# Altium footprint library SBCLib.PcbLib: 120 footprints (part 1 of 8)
Each footprint in its own frame and in the unit in brackets; x right, y up, seen from the top. Pads: shape width x height; smd on the part's side, far side on the other; paste and mask are expansions set on the pad; w line width, h text height; cw(c..) or ccw(c..) is an arc to the next point about the centre after c.
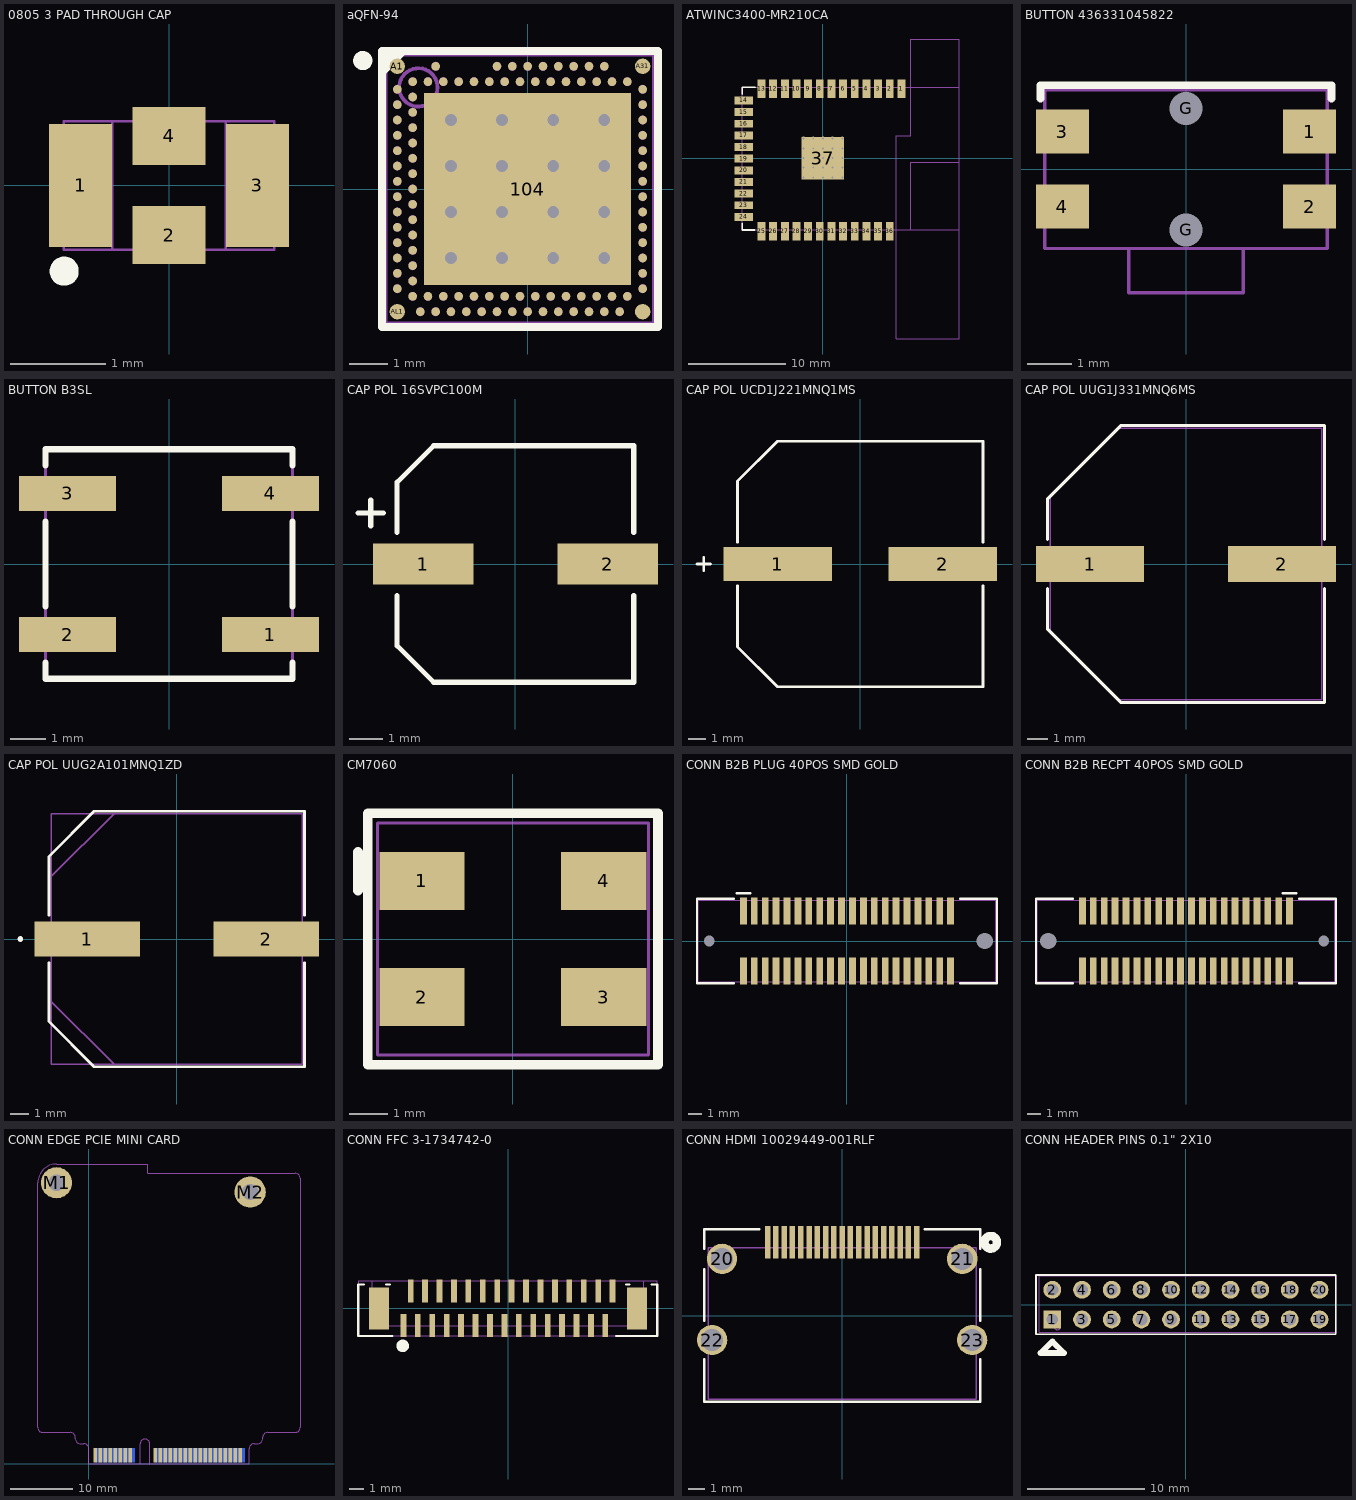
[diagram p0: the footprints below, top view; thin cyan lines are the x and y axes]

## 0805 3 PAD THROUGH CAP [mil]
pads (4):
  rect 26x51 smd paste+0 mask+0: 1(-36.5,0) 3(36.5,0)
  rect 30x24 smd paste+0 mask+0: 2(0,-20.5) 4(0,20.5)
Top Overlay:
  circle w6: c-43.31,-35.43 r3
Mechanical 3:
  circle w0: c-26.5,0 r3
  lines w1: -43.5,-26.5 -23.5,-26.5 -23.5,26.5 -43.5,26.5 ; -43.5,-26.5 -43.5,26.5 ; -43.5,-26.5 -43.5,26.5 ; -43.5,-26.5 43.5,-26.5 ; -43.5,26.5 43.5,26.5 ; 43.5,-26.5 23.5,-26.5 23.5,26.5 43.5,26.5 ; 43.5,-26.5 43.5,26.5 ; 43.5,-26.5 43.5,26.5
3D body "NFM21PC225B0J3D_MUR.step": height 37.01, standoff 0, extent -43.5,-26.18 43.5,26.81

## aQFN-94 [mm] "NRF5340"
pads (115):
  rect 5.4x5 smd paste-5 mask+0.05: 104(0,0)
  round 0.4 smd paste+0.012 mask+0.05: A1(-3.4,3.2) A31(3,3.2) AL1(-3.4,-3.2) AL31(3,-3.2)
  round 0.225 smd paste+0.012 mask+0.05: A5(-2.4,3.2) A13(-0.8,3.2) A15(-0.4,3.2) A17(0,3.2) A19(0.4,3.2) A21(0.8,3.2) A23(1.2,3.2) A25(1.6,3.2) A27(2,3.2) AA1(-3.4,-1) AA31(3,-1) AB2(-3,-1.2) AC1(-3.4,-1.4) AC31(3,-1.4) AD2(-3,-1.6) AE1(-3.4,-1.8) AE31(3,-1.8) AF2(-3,-2) AG1(-3.4,-2.2) AG31(3,-2.2) AH2(-3,-2.4) AJ1(-3.4,-2.6) AJ31(3,-2.6) AK2(-3,-2.8) AK4(-2.6,-2.8) AK6(-2.2,-2.8) AK8(-1.8,-2.8) AK10(-1.4,-2.8) AK12(-1,-2.8) AK14(-0.6,-2.8) AK16(-0.2,-2.8) AK18(0.2,-2.8) AK20(0.6,-2.8) AK22(1,-2.8) AK24(1.4,-2.8) AK26(1.8,-2.8) AK28(2.2,-2.8) AK30(2.6,-2.8) AL3(-2.8,-3.2) AL5(-2.4,-3.2) AL7(-2,-3.2) AL9(-1.6,-3.2) AL11(-1.2,-3.2) AL13(-0.8,-3.2) AL15(-0.4,-3.2) AL17(0,-3.2) AL19(0.4,-3.2) AL21(0.8,-3.2) AL23(1.2,-3.2) AL25(1.6,-3.2) AL27(2,-3.2) AL29(2.4,-3.2) B2(-3,2.8) B4(-2.6,2.8) B6(-2.2,2.8) B8(-1.8,2.8) B10(-1.4,2.8) B12(-1,2.8) B14(-0.6,2.8) B16(-0.2,2.8) B18(0.2,2.8) B20(0.6,2.8) B22(1,2.8) B24(1.4,2.8) B26(1.8,2.8) B28(2.2,2.8) B30(2.6,2.8) C1(-3.4,2.6) C31(3,2.6) D2(-3,2.4) E1(-3.4,2.2) E31(3,2.2) F2(-3,2) G1(-3.4,1.8) G31(3,1.8) H2(-3,1.6) J1(-3.4,1.4) J31(3,1.4) K2(-3,1.2) L1(-3.4,1) L31(3,1) M2(-3,0.8) N1(-3.4,0.6) N31(3,0.6) P2(-3,0.4) R1(-3.4,0.2) R31(3,0.2) T2(-3,0) U1(-3.4,-0.2) U31(3,-0.2) V2(-3,-0.4) W1(-3.4,-0.6) W31(3,-0.6) Y2(-3,-0.8)
  rrect50% 1.1x1 on Top Paste: ""(-1.95,-1.8) ""(-1.95,-0.6) ""(-1.95,0.6) ""(-1.95,1.8) ""(-0.65,-1.8) ""(-0.65,-0.6) ""(-0.65,0.6) ""(-0.65,1.8) ""(0.65,-1.8) ""(0.65,-0.6) ""(0.65,0.6) ""(0.65,1.8) ""(1.95,-1.8) ""(1.95,-0.6) ""(1.95,0.6) ""(1.95,1.8)
via -2,1.8 diameter 0.61 hole 0.305
via -0.667,1.8 diameter 0.61 hole 0.305
via 0.667,1.8 diameter 0.61 hole 0.305
via 2,1.8 diameter 0.61 hole 0.305
via -2,0.6 diameter 0.61 hole 0.305
via -0.667,0.6 diameter 0.61 hole 0.305
via 0.667,0.6 diameter 0.61 hole 0.305
via 2,0.6 diameter 0.61 hole 0.305
via -2,-0.6 diameter 0.61 hole 0.305
via -0.667,-0.6 diameter 0.61 hole 0.305
via 0.667,-0.6 diameter 0.61 hole 0.305
via 2,-0.6 diameter 0.61 hole 0.305
via -2,-1.8 diameter 0.61 hole 0.305
via -0.667,-1.8 diameter 0.61 hole 0.305
via 0.667,-1.8 diameter 0.61 hole 0.305
via 2,-1.8 diameter 0.61 hole 0.305
Top Overlay:
  circle w0.25: c-4.3,3.35 r0.125
  region: -3.2,3.5 -3.7,3 -3.7,3.5
  lines w0.2: -3.8,-3.6 -3.8,3.6 3.4,3.6 3.4,-3.6 -3.8,-3.6
Mechanical 3:
  circle w0.1: c-2.85,2.65 r0.5
  lines w0.1: -3.7,-3.5 3.3,-3.5 3.3,3.5 -3.7,3.5 -3.7,-3.5
  text ".Designator" at -3.4,-0.3 h0.64
Mechanical 7:
  drawing of 564 lines, arcs and shapes, not listed
  text "A27" at 1.898,3.361 h0.08
  text "A17" at -0.102,3.361 h0.08
  text "AL27" at 1.856,-3.439 h0.08
  text "AL17" at -0.144,-3.439 h0.08
  text "AL7" at -2.115,-3.439 h0.08
  text "T2" at -3.328,-0.04 h0.08
  text "F2" at -3.328,1.96 h0.08
  text "AF2" at -3.408,-2.04 h0.08
  text "B28" at 2.102,2.961 h0.08
  text "B30" at 2.502,2.961 h0.08
  text "C31" at 3.122,2.56 h0.08
  text "E31" at 3.122,2.16 h0.08
  text "N31" at 3.122,0.56 h0.08
  text "R31" at 3.122,0.16 h0.08
  text "L31" at 3.122,0.96 h0.08
  text "G31" at 3.122,1.76 h0.08
  text "J31" at 3.122,1.36 h0.08
  text "AE31" at 3.122,-1.84 h0.08
  text "AC31" at 3.122,-1.44 h0.08
  text "W31" at 3.122,-0.64 h0.08
  text "AA31" at 3.122,-1.04 h0.08
  text "U31" at 3.122,-0.24 h0.08
  text "AK30" at 2.462,-3.039 h0.08
  text "AJ31" at 3.122,-2.64 h0.08
  text "AG31" at 3.122,-2.24 h0.08
  text "AK28" at 2.062,-3.039 h0.08
  text "AL29" at 2.256,-3.439 h0.08
  text "B26" at 1.702,2.961 h0.08
  text "B22" at 0.902,2.961 h0.08
  text "A19" at 0.298,3.361 h0.08
  text "B18" at 0.102,2.961 h0.08
  text "A21" at 0.698,3.36 h0.08
  text "B20" at 0.502,2.961 h0.08
  text "A25" at 1.498,3.361 h0.08
  text "A23" at 1.098,3.36 h0.08
  text "B24" at 1.302,2.961 h0.08
  text "AK26" at 1.662,-3.039 h0.08
  text "AK22" at 0.862,-3.039 h0.08
  text "AL19" at 0.256,-3.439 h0.08
  text "AK18" at 0.062,-3.039 h0.08
  text "AL21" at 0.656,-3.439 h0.08
  text "AK20" at 0.462,-3.04 h0.08
  text "AL25" at 1.456,-3.439 h0.08
  text "AL23" at 1.056,-3.439 h0.08
  text "AK24" at 1.262,-3.039 h0.08
  text "B16" at -0.298,2.961 h0.08
  text "A15" at -0.502,3.361 h0.08
  text "B8" at -1.869,2.961 h0.08
  text "B12" at -1.098,2.961 h0.08
  text "B10" at -1.498,2.961 h0.08
  text "A13" at -0.902,3.36 h0.08
  text "B14" at -0.698,2.961 h0.08
  text "AK16" at -0.338,-3.039 h0.08
  text "AL15" at -0.544,-3.439 h0.08
  text "AL9" at -1.744,-3.439 h0.08
  text "AK8" at -1.908,-3.039 h0.08
  text "AK12" at -1.138,-3.039 h0.08
  text "AL11" at -1.344,-3.439 h0.08
  text "AK10" at -1.538,-3.04 h0.08
  text "AL13" at -0.944,-3.439 h0.08
  text "AK14" at -0.738,-3.039 h0.08
  text "B6" at -2.269,2.961 h0.08
  text "B2" at -3.053,2.947 h0.08
  text "A5" at -2.472,3.361 h0.08
  text "B4" at -2.669,2.961 h0.08
  text "C1" at -3.669,2.56 h0.08
  text "E1" at -3.649,2.16 h0.08
  text "D2" at -3.328,2.36 h0.08
  text "K2" at -3.328,1.16 h0.08
  text "N1" at -3.649,0.56 h0.08
  text "R1" at -3.656,0.16 h0.08
  text "P2" at -3.328,0.36 h0.08
  text "L1" at -3.689,0.96 h0.08
  text "M2" at -3.328,0.76 h0.08
  text "G1" at -3.669,1.76 h0.08
  text "J1" at -3.669,1.36 h0.08
  text "H2" at -3.328,1.56 h0.08
  text "AB2" at -3.408,-1.24 h0.08
  text "AE1" at -3.721,-1.84 h0.08
  text "AC1" at -3.741,-1.44 h0.08
  text "AD2" at -3.408,-1.64 h0.08
  text "W1" at -3.669,-0.64 h0.08
  text "AA1" at -3.734,-1.04 h0.08
  text "Y2" at -3.328,-0.84 h0.08
  text "U1" at -3.669,-0.24 h0.08
  text "V2" at -3.328,-0.44 h0.08
  text "AK6" at -2.308,-3.039 h0.08
  text "AL3" at -2.915,-3.439 h0.08
  text "AK2" at -3.108,-3.013 h0.08
  text "AL5" at -2.515,-3.439 h0.08
  text "AK4" at -2.708,-3.039 h0.08
  text "AH2" at -3.408,-2.44 h0.08
  text "AJ1" at -3.741,-2.64 h0.08
  text "AG1" at -3.741,-2.24 h0.08
3D body "aQFN-116 (7x7).step": height 0.85, standoff -0.05, extent -3.7,-3.5 3.3,3.5

## ATWINC3400-MR210CA [mm]
pads (37):
  rect 0.813x1.88 smd: 1(8.103,7.159) 2(6.899,7.159) 3(5.695,7.159) 4(4.491,7.159) 5(3.287,7.159) 6(2.083,7.159) 7(0.879,7.159) 8(-0.325,7.159) 9(-1.529,7.159) 10(-2.733,7.159) 11(-3.937,7.159) 12(-5.141,7.159) 13(-6.345,7.159) 25(-6.345,-7.573) 26(-5.141,-7.573) 27(-3.937,-7.573) 28(-2.733,-7.573) 29(-1.529,-7.573) 30(-0.325,-7.573) 31(0.879,-7.573) 32(2.083,-7.573) 33(3.287,-7.573) 34(4.491,-7.573) 35(5.695,-7.573) 36(6.899,-7.573)
  rect 1.88x0.813 smd: 14(-8.184,5.955) 15(-8.184,4.751) 16(-8.184,3.547) 17(-8.184,2.343) 18(-8.184,1.139) 19(-8.184,-0.065) 20(-8.184,-1.269) 21(-8.184,-2.473) 22(-8.184,-3.677) 23(-8.184,-4.881) 24(-8.184,-6.085)
  rect 4.4x4.4 smd: 37(0,0)
via 0,-2 diameter 0.406 hole 0.203
via 1,-2 diameter 0.406 hole 0.203
via 2,-2 diameter 0.406 hole 0.203
via -1,-2 diameter 0.406 hole 0.203
via -2,-2 diameter 0.406 hole 0.203
via 0,-1 diameter 0.406 hole 0.203
via 1,-1 diameter 0.406 hole 0.203
via 2,-1 diameter 0.406 hole 0.203
via -1,-1 diameter 0.406 hole 0.203
via -2,-1 diameter 0.406 hole 0.203
via 0,2 diameter 0.406 hole 0.203
via 1,2 diameter 0.406 hole 0.203
via 2,2 diameter 0.406 hole 0.203
via -1,2 diameter 0.406 hole 0.203
via -2,2 diameter 0.406 hole 0.203
via 0,1 diameter 0.406 hole 0.203
via 1,1 diameter 0.406 hole 0.203
via 2,1 diameter 0.406 hole 0.203
via -1,1 diameter 0.406 hole 0.203
via -2,1 diameter 0.406 hole 0.203
via -2,0 diameter 0.406 hole 0.203
via -1,0 diameter 0.406 hole 0.203
via 2,0 diameter 0.406 hole 0.203
via 1,0 diameter 0.406 hole 0.203
via 0,0 diameter 0.406 hole 0.203
Top Overlay:
  lines w0.178: -8.326,-6.761 -8.326,-7.431 -7.078,-7.431 ; -8.326,6.597 -8.326,7.301 -7.023,7.301
Mechanical 3:
  lines w0.076: 9.1,7.301 14.1,7.301 ; 14.1,7.301 14.1,-7.431 -8.326,-7.431 -8.326,7.301 14.1,7.301
Mechanical 7:
  lines w0.076: 14.1,-0.431 9.1,-0.431 9.1,-7.431 14.1,-7.431 14.1,-18.699 7.6,-18.699 7.6,2.301 9.1,2.301 9.1,7.301 ; 9.1,7.301 9.1,12.301 14.1,12.301 14.1,7.301 9.1,7.301
3D body "User Library-ATWINC3400-MR210CA122.STEP": height 2.19, standoff -0.02, extent -8.326,-7.431 14.1,7.301

## BUTTON 436331045822 [mm]
pads (6):
  rect 1.2x1 smd: 1(2.8,0.85) 2(2.8,-0.85) 3(-2.8,0.85) 4(-2.8,-0.85)
  round 0.5 hole 0.75 unplated: G(0,-1.375) G(0,1.375)
Top Overlay:
  lines w0.178: -3.3,1.6 -3.3,1.9 -1.6,1.9 3.3,1.9 3.3,1.6
Mechanical 3:
  lines w0.076: -1.3,-1.8 -1.3,-2.8 1.3,-2.8 1.3,-1.8 ; -3.2,-1.8 -3.2,1.8 3.2,1.8 3.2,-1.8 -3.2,-1.8
3D body "436331045822_Download_STP_436331045822_rev1.stp": height 1.65, standoff -0.5, extent -3.2,-2.75 3.2,1.75

## BUTTON B3SL [mm]
pads (4):
  rect 2.75x1 smd: 1(2.875,-2) 2(-2.875,-2) 3(-2.875,2) 4(2.875,2)
Top Overlay:
  lines w0.178: -3.5,-2.8 -3.5,-3.25 3.5,-3.25 3.5,-2.8 ; -3.5,-1.2 -3.5,1.2 ; -3.5,2.8 -3.5,3.25 3.5,3.25 3.5,2.8 ; 3.5,-1.2 3.5,1.2
Mechanical 3:
  lines w0.076: -3.5,-3.25 -3.5,3.25 3.5,3.25 3.5,-3.25 -3.5,-3.25
3D body "B3SL-1000P--3DModel-STEP-273799.STEP": height 3.4, standoff 0, extent -3.5,-3.25 3.5,3.25

## CAP POL 16SVPC100M [mil]
pads (2):
  rect 118x48 smd paste+0 mask+0: 1(-108.5,0) 2(108.5,0)
Top Overlay:
  lines w6: -185,60 -155,60 ; -170,45 -170,75 ; -139,-37.1 -139,-96 -96,-139 139,-139 139,-37.1 ; -139,37.1 -139,96 -96,139 139,139 139,37.1
3D body "PCAP_SVP_C6_PAN.step": height 238.11, standoff 0, extent -147.48,-134.01 147.49,134.02

## CAP POL UCD1J221MNQ1MS [mil]
pads (2):
  rect 240.5x75 smd paste+0 mask+0: 1(-183.25,0) 2(183.25,0)
Top Overlay:
  lines w6: -362.5,0 -332.5,0 ; -347.5,-15 -347.5,15 ; -272.5,-48.6 -272.5,-184.19 -184.19,-272.5 272.5,-272.5 272.5,-48.6 ; -272.5,48.6 -272.5,184.19 -184.19,272.5 272.5,272.5 272.5,48.6
Mechanical 3:
  lines w3: -272.5,-48.6 -272.5,-184.19 -184.19,-272.5 272.5,-272.5 272.5,-48.6 ; -272.5,48.6 -272.5,184.19 -184.19,272.5 272.5,272.5 272.5,48.6
Mechanical 13:
  lines w1: -362.5,0 -332.5,0 ; -347.5,-15 -347.5,15
3D body "PCAP_12_5x13_5-ELECT_NCA.step": height 573.11, standoff 0, extent -275.5,-271.49 275.52,271.5

## CAP POL UUG1J331MNQ6MS [mil]
pads (2):
  rect 213x71 smd paste+0 mask+0: 1(-189,0) 2(189,0)
Top Overlay:
  lines w6: -272.5,-48.6 -272.5,-128.75 -128.75,-272.5 272.5,-272.5 272.5,-48.6 ; -272.5,48.6 -272.5,128.75 -128.75,272.5 272.5,272.5 272.5,48.6
  lines w7: -267.5,-133.75 -133.75,-267.5 ; -267.5,133.75 -133.75,267.5
Mechanical 3:
  lines w3: -267.5,-133.75 -133.75,-267.5 ; -267.5,-133.75 -267.5,133.75 ; -267.5,-133.75 -133.75,-267.5 ; -267.5,133.75 -133.75,267.5 ; -267.5,133.75 -133.75,267.5 ; -133.75,-267.5 267.5,-267.5 267.5,267.5 -133.75,267.5
3D body "CAP_UUG_12P5X21_NCH.step": height 868.11, standoff 0, extent -275.5,-267.48 275.52,267.49

## CAP POL UUG2A101MNQ1ZD [mil]
pads (2):
  rect 225x75 smd paste+0 mask+0: 1(-191,0) 2(191,0)
Top Overlay:
  circle w6: c-333.5,0 r3
  lines w6: -272.5,-50.6 -272.5,-176.32 -176.32,-272.5 272.5,-272.5 272.5,-50.6 ; -272.5,50.6 -272.5,176.32 -176.32,272.5 272.5,272.5 272.5,50.6
Mechanical 3:
  circle w3: c-247.5,0 r3
  lines w3: -267.5,-133.75 -133.75,-267.5 ; -267.5,133.75 -133.75,267.5 ; -267.5,-267.5 267.5,-267.5 267.5,267.5 -267.5,267.5 -267.5,-267.5
3D body "CAP_UUE_12P5X16_NCH.step": height 671.1, standoff 0, extent -275.5,-267.48 275.52,267.49

## CM7060 [mm]
pads (4):
  rect 2.2x1.5 smd: 1(-2.35,1.5) 2(-2.35,-1.5) 3(2.35,-1.5) 4(2.35,1.5)
Top Overlay:
  lines w0.254: -4,1.25 -4,2.25 ; -3.75,-3.25 3.75,-3.25 3.75,3.25 -3.75,3.25 -3.75,-3.25
Mechanical 3:
  lines w0.076: -3.5,-3 -3.5,3 3.5,3 3.5,-3 -3.5,-3
3D body: height 3.8, standoff 0, extent -3.5,-3 3.5,3

## CONN B2B PLUG 40POS SMD GOLD [mm] "10144518"
pads (42):
  rect 0.5x2 smd: 1(-7.6,2.2) 2(-7.6,-2.2) 3(-6.8,2.2) 4(-6.8,-2.2) 5(-6,2.2) 6(-6,-2.2) 7(-5.2,2.2) 8(-5.2,-2.2) 9(-4.4,2.2) 10(-4.4,-2.2) 11(-3.6,2.2) 12(-3.6,-2.2) 13(-2.8,2.2) 14(-2.8,-2.2) 15(-2,2.2) 16(-2,-2.2) 17(-1.2,2.2) 18(-1.2,-2.2) 19(-0.4,2.2) 20(-0.4,-2.2) 21(0.4,2.2) 22(0.4,-2.2) 23(1.2,2.2) 24(1.2,-2.2) 25(2,2.2) 26(2,-2.2) 27(2.8,2.2) 28(2.8,-2.2) 29(3.6,2.2) 30(3.6,-2.2) 31(4.4,2.2) 32(4.4,-2.2) 33(5.2,2.2) 34(5.2,-2.2) 35(6,2.2) 36(6,-2.2) 37(6.8,2.2) 38(6.8,-2.2) 39(7.6,2.2) 40(7.6,-2.2)
  round 0.5 hole 0.8 unplated: M1(-10.1,0)
  round 0.5 hole 1.2 unplated: M1(10.1,0)
Top Overlay:
  lines w0.178: -8.3,-3.1 -11,-3.1 -11,3.1 -8.3,3.1 ; -8.1,3.5 -7.1,3.5 ; 8.3,-3.1 11,-3.1 11,3.1 8.3,3.1
Mechanical 3:
  lines w0.076: -10.9,-3 10.9,-3 10.9,3 -10.9,3 -10.9,-3
3D body "10144518-041x0xxx.stp": height 4.65, standoff -0.7, extent -10.9,-3 10.9,3

## CONN B2B RECPT 40POS SMD GOLD [mm] "10144517"
pads (42):
  rect 0.5x2 smd: 1(7.6,2.2) 2(7.6,-2.2) 3(6.8,2.2) 4(6.8,-2.2) 5(6,2.2) 6(6,-2.2) 7(5.2,2.2) 8(5.2,-2.2) 9(4.4,2.2) 10(4.4,-2.2) 11(3.6,2.2) 12(3.6,-2.2) 13(2.8,2.2) 14(2.8,-2.2) 15(2,2.2) 16(2,-2.2) 17(1.2,2.2) 18(1.2,-2.2) 19(0.4,2.2) 20(0.4,-2.2) 21(-0.4,2.2) 22(-0.4,-2.2) 23(-1.2,2.2) 24(-1.2,-2.2) 25(-2,2.2) 26(-2,-2.2) 27(-2.8,2.2) 28(-2.8,-2.2) 29(-3.6,2.2) 30(-3.6,-2.2) 31(-4.4,2.2) 32(-4.4,-2.2) 33(-5.2,2.2) 34(-5.2,-2.2) 35(-6,2.2) 36(-6,-2.2) 37(-6.8,2.2) 38(-6.8,-2.2) 39(-7.6,2.2) 40(-7.6,-2.2)
  round 0.5 hole 1.2 unplated: M1(-10.1,0)
  round 0.5 hole 0.8 unplated: M1(10.1,0)
Top Overlay:
  lines w0.178: -8.3,-3.1 -11,-3.1 -11,3.1 -8.3,3.1 ; 7.1,3.5 8.1,3.5 ; 8.3,-3.1 11,-3.1 11,3.1 8.3,3.1
Mechanical 3:
  lines w0.076: -10.9,-3 10.9,-3 10.9,3 -10.9,3 -10.9,-3
3D body "10144517-041x0xlf.stp": height 3.7, standoff -0.65, extent -10.9,-3 10.9,3

## CONN EDGE PCIE MINI CARD [mm]
pads (54):
  rect 0.6x2.3 smd paste-5: 1(1.05,1.4) 3(1.85,1.4) 5(2.65,1.4) 7(3.45,1.4) 9(4.25,1.4) 11(5.05,1.4) 13(5.85,1.4) 15(6.65,1.4) 17(10.65,1.4) 19(11.45,1.4) 21(12.25,1.4) 23(13.05,1.4) 25(13.85,1.4) 27(14.65,1.4) 29(15.45,1.4) 31(16.25,1.4) 33(17.05,1.4) 35(17.85,1.4) 37(18.65,1.4) 39(19.45,1.4) 41(20.25,1.4) 43(21.05,1.4) 45(21.85,1.4) 47(22.65,1.4) 49(23.45,1.4) 51(24.25,1.4)
  rect 0.6x2.3 smd far side paste-5: 2(1.45,1.4) 4(2.25,1.4) 6(3.05,1.4) 8(3.85,1.4) 10(4.65,1.4) 12(5.45,1.4) 14(6.25,1.4) 16(7.05,1.4) 18(11.05,1.4) 20(11.85,1.4) 22(12.65,1.4) 24(13.45,1.4) 26(14.25,1.4) 28(15.05,1.4) 30(15.85,1.4) 32(16.65,1.4) 34(17.45,1.4) 36(18.25,1.4) 38(19.05,1.4) 40(19.85,1.4) 42(20.65,1.4) 44(21.45,1.4) 46(22.25,1.4) 48(23.05,1.4) 50(23.85,1.4) 52(24.65,1.4)
  round 5 hole 2.6 paste-5: M1(-5.15,45.05) M2(25.85,43.55)
Mechanical 1:
  lines w0.178: -7.35,5.05 cw(c-7.35,5.85) -8.15,5.85 -8.15,45.05 cw(c-5.15,45.05) -5.15,48.05 9.437,48.05 9.437,46.55 27.85,46.55 33.05,46.55 cw(c33.05,45.75) 33.85,45.75 33.85,5.85 ; -7.35,5.05 -2.95,5.05 ; -7.35,5.05 -7.35,5.05 ; -2.95,5.05 cw(c-2.95,4.25) -2.15,4.25 -2.15,4.05 ccw(c-1.35,4.05) -1.35,3.25 ; -2.95,5.05 -2.95,5.05 ; -1.35,3.25 -1.35,3.25 ; -1.35,3.25 -0.8,3.25 cw(c-0.8,2.45) 0,2.45 0,0 8.25,0 8.25,3.25 cw(c9,3.25) 9.75,3.25 9.75,0 25.7,0 25.7,2.45 cw(c26.5,2.45) 26.5,3.25 27.05,3.25 ccw(c27.05,4.05) 27.85,4.05 ; 27.85,4.05 27.85,4.05 ; 27.85,4.05 27.85,4.25 cw(c28.65,4.25) 28.65,5.05 33.05,5.05 ccw(c33.05,5.85) 33.85,5.85 ; 33.85,5.85 33.85,5.85
Mechanical 4:
  lines w0.178: 0,0 25.7,0

## CONN FFC 3-1734742-0 [mm]
pads (32):
  rect 0.4x1.6 smd: 1(-7.25,-1.2) 2(-6.75,1.2) 3(-6.25,-1.2) 4(-5.75,1.2) 5(-5.25,-1.2) 6(-4.75,1.2) 7(-4.25,-1.2) 8(-3.75,1.2) 9(-3.25,-1.2) 10(-2.75,1.2) 11(-2.25,-1.2) 12(-1.75,1.2) 13(-1.25,-1.2) 14(-0.75,1.2) 15(-0.25,-1.2) 16(0.25,1.2) 17(0.75,-1.2) 18(1.25,1.2) 19(1.75,-1.2) 20(2.25,1.2) 21(2.75,-1.2) 22(3.25,1.2) 23(3.75,-1.2) 24(4.25,1.2) 25(4.75,-1.2) 26(5.25,1.2) 27(5.75,-1.2) 28(6.25,1.2) 29(6.75,-1.2) 30(7.25,1.2)
  rect 1.4x2.9 smd: ""(-8.95,0) ""(8.95,0)
Top Overlay:
  circle w0.508: c-7.3,-2.6 r0.178
  lines w0.152: -10.379,-1.906 -10.379,1.65 -9.979,1.65 ; -10.35,-1.906 -8,-1.906 ; -8.442,1.65 -8.203,1.65 ; 7.5,-1.906 10.35,-1.906 10.35,1.65 9.95,1.65 ; 8.174,1.65 8.414,1.65
Mechanical 3:
  lines w0.076: -10.35,1.9 10.35,1.9 ; -10.35,1.9 -10.35,-1.9 10.35,-1.9 10.35,1.9 ; -10.35,1.9 -9.4,1.9 -9.4,-1.2 9.4,-1.2 9.4,1.9 10.35,1.9
3D body "c-3-1734742-0-o-3d.stp": height 4.2, standoff 0.05, extent -10.35,-1.9 10.35,1.9

## CONN HDMI 10029449-001RLF [mil]
pads (23):
  rect 13x77 smd paste+0 mask+0: 1(177.17,174.41) 2(157.48,174.41) 3(137.8,174.41) 4(118.11,174.41) 5(98.43,174.41) 6(78.74,174.41) 7(59.06,174.41) 8(39.37,174.41) 9(19.68,174.41) 10(0,174.41) 11(-19.68,174.41) 12(-39.37,174.41) 13(-59.06,174.41) 14(-78.74,174.41) 15(-98.43,174.41) 16(-118.11,174.41) 17(-137.8,174.41) 18(-157.48,174.41) 19(-177.17,174.41)
  round 72 hole 52: 20(-285.43,135.04) 21(285.43,135.04) 22(-309.06,-57.87) 23(309.06,-57.87)
Top Overlay:
  circle w20: c353,174.41 r15
  lines w6: -328,-103.17 -328,-205 328,-205 328,-103.17 ; -328,-12.58 -328,110.57 ; -328,159.51 -328,205 -196.77,205 ; 196.77,205 328,205 328,159.51 ; 328,-12.58 328,110.57
Bottom Overlay:
  circle w20: c353,174.41 r15
Mechanical 3:
  lines w3: -318.89,-198.82 -318.89,161.42 318.9,161.42 318.9,-198.82 -318.89,-198.82
3D body "10029449-001lf.stp": height 247.05, standoff -67.91, extent -318.89,-198.82 318.9,161.42

## CONN HEADER PINS 0.1" 2X10 [mil]
pads (20):
  rect 60x60 hole 38 mask+0: 1(-450,-50)
  round 60 hole 40 mask+0: 2(-450,50) 3(-350,-50) 4(-350,50) 5(-250,-50) 6(-250,50) 7(-150,-50) 8(-150,50) 9(-50,-50) 10(-50,50) 11(50,-50) 12(50,50) 13(150,-50) 14(150,50) 15(250,-50) 16(250,50) 17(350,-50) 18(350,50) 19(450,-50) 20(450,50)
Top Overlay:
  lines w6: -505,-100 -505,100 505,100 505,-100 -505,-100
  lines w19.68: -489.37,-163.39 -450,-124.02 -410.63,-163.39 -489.37,-163.39
Mechanical 3:
  circle w0: c-433.07,-74.8 r10
  lines w1: -494.49,-93.43 -494.49,96.57 505.51,96.57 505.51,-93.43 -494.49,-93.43
3D body "67996-420HLF_AMP.step": height 350, standoff -200, extent -499.99,-99.99 500.01,100.01